# Altium footprint library Evaluation Board.PcbLib: 121 footprints (part 3 of 8)
Each footprint in its own frame and in the unit in brackets; x right, y up, seen from the top. Pads: shape width x height; smd on the part's side, far side on the other; paste and mask are expansions set on the pad; w line width, h text height; cw(c..) or ccw(c..) is an arc to the next point about the centre after c.
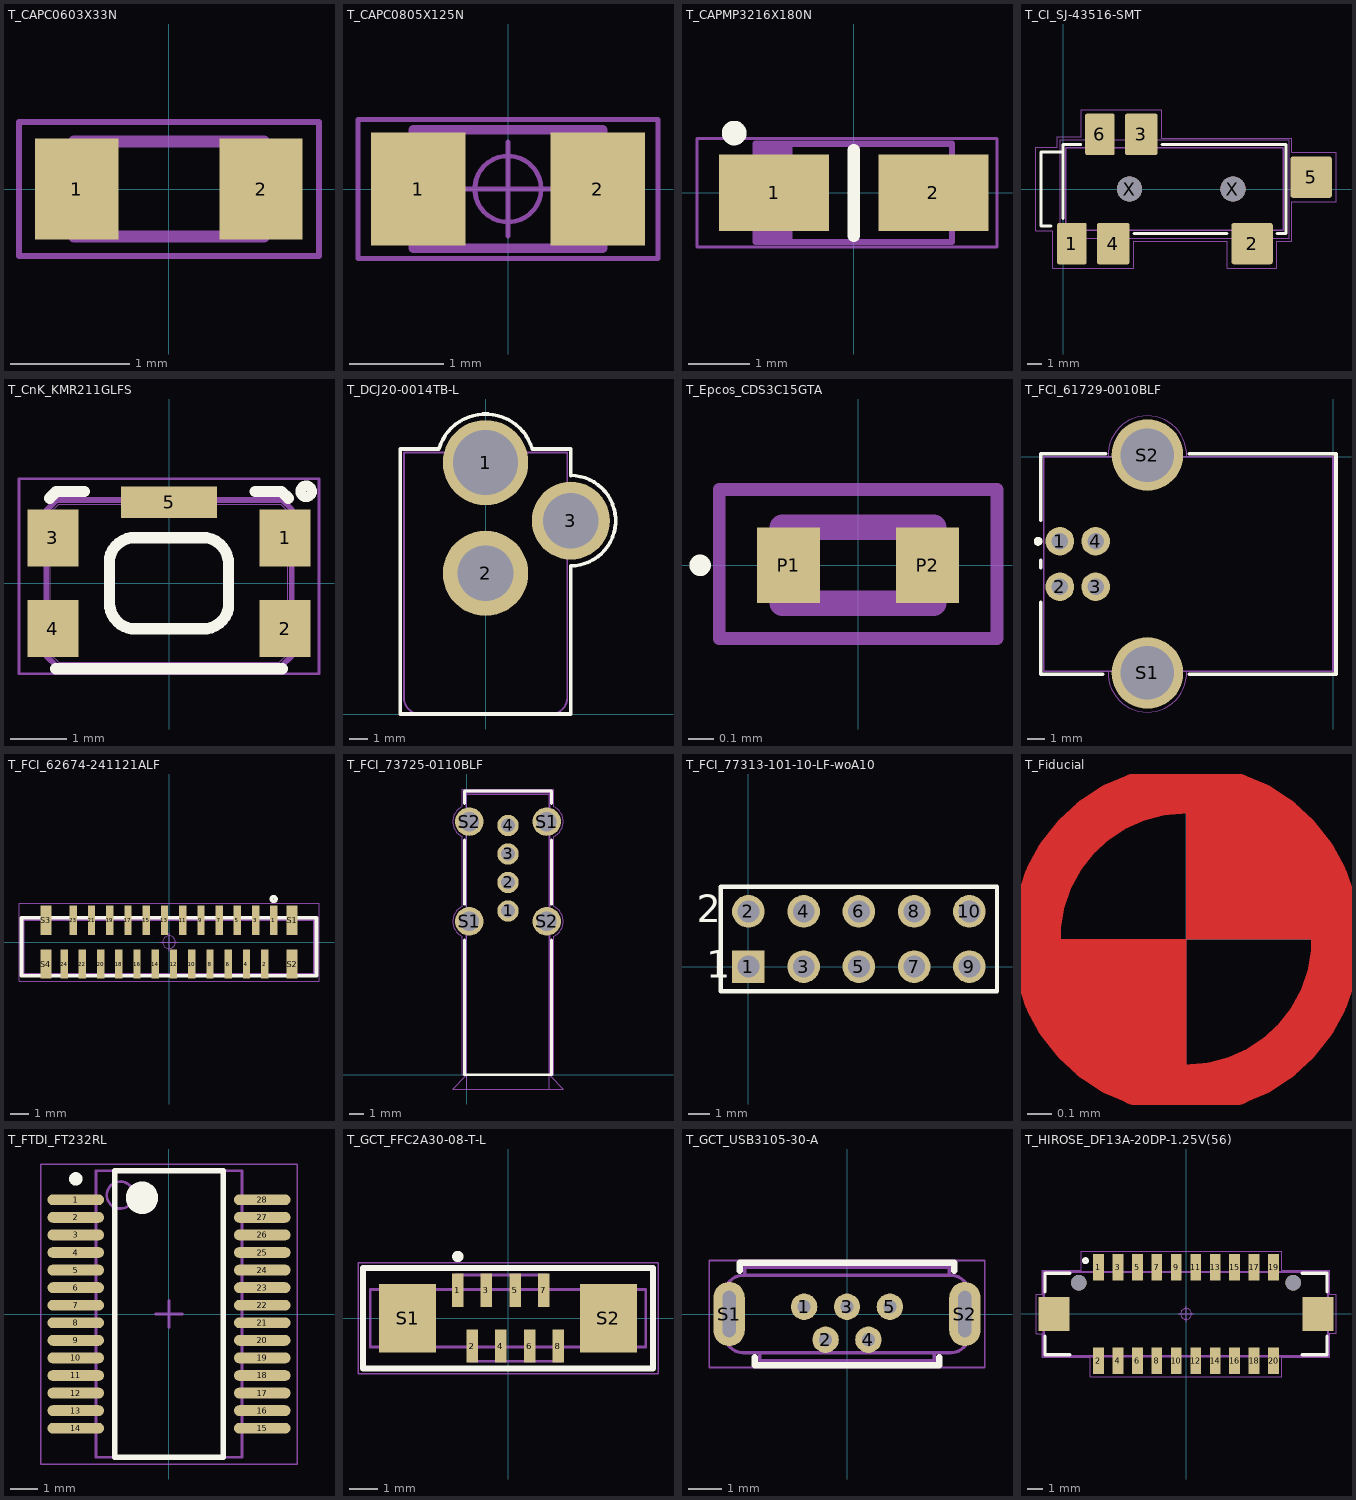
[diagram p2: the footprints below, top view; thin cyan lines are the x and y axes]

## T_CAPC0603X33N [mm]
height 0.8
pads (2):
  rect 0.7x0.85 smd: 1(-0.775,0) 2(0.775,0)
Mechanical 1:
  lines w0.05: -1.261,-0.563 -1.261,0.563 1.262,0.563 1.262,-0.563 -1.261,-0.563
Mechanical 2:
  lines w0.001: -0.8,-0.4 -0.8,0.4 0.8,0.4 0.8,-0.4 -0.8,-0.4
Mechanical 3:
  lines w0.1: -0.8,-0.4 -0.8,0.4 0.8,0.4 0.8,-0.4 -0.8,-0.4
3D body: height 0.9, standoff 0, extent -0.8,-0.4 0.8,0.4

## T_CAPC0805X125N [mm]
height 1.25
pads (2):
  rect 1x1.2 smd: 1(-0.95,0) 2(0.95,0)
Mechanical 1:
  circle w0.05: c0,0 r0.35
  lines w0.05: -0.5,0 0.5,0 ; 0,-0.5 0,0.5 ; -1.586,-0.736 1.586,-0.736 1.586,0.736 -1.586,0.736 -1.586,-0.736
Mechanical 2:
  lines w0.001: -1,-0.625 -1,0.625 1,0.625 1,-0.625 -1,-0.625
Mechanical 3:
  lines w0.1: -1,-0.625 1,-0.625 1,0.625 -1,0.625 -1,-0.625
3D body: height 1.4, standoff 0, extent -1,-0.625 1,0.625

## T_CAPMP3216X180N [mm]
height 1.6
pads (2):
  rect 1.8x1.25 smd: 1(-1.3,0) 2(1.3,0)
Top Overlay:
  circle w0.3: c-1.95,0.975 r0.05
  lines w0.2: 0,-0.699 0,0.699
Mechanical 1:
  lines w0.05: -2.556,-0.886 2.336,-0.886 2.336,0.886 -2.556,0.886 -2.556,-0.886
Mechanical 2:
  lines w0.001: -1.6,-0.8 -1.6,0.8 1.6,0.8 1.6,-0.8 -1.6,-0.8
Mechanical 3:
  lines w0.1: -1.55,-0.8 -1.55,0.8 ; -1.45,-0.8 -1.45,0.8 ; -1.35,-0.8 -1.35,0.8 ; -1.25,-0.8 -1.25,0.8 ; -1.15,-0.8 -1.15,0.8 ; -1.05,-0.8 -1.05,0.8 ; -1.6,-0.8 -1.6,0.8 1.6,0.8 1.6,-0.8 -1.6,-0.8
3D body: height 1.6, standoff 0, extent -1.6,-0.8 -1,0.8
3D body: height 1.6, standoff 0, extent -1,-0.8 1.6,0.8

## T_CI_SJ-43516-SMT [mm] "STEREO_3.5mm AUDIO JACK  CUI"
height 5
pads (8):
  rrect12% 2x2.8 smd: 1(0.6,-3.7) 6(2.5,3.7)
  rrect12% 2.8x2.8 smd: 2(12.8,-3.7) 5(16.8,0.8)
  rrect12% 2.2x2.8 smd: 3(5.3,3.7) 4(3.4,-3.7)
  round 1.7 hole 1.7 unplated: X(4.5,0) X(11.5,0)
Top Overlay:
  lines w0.2: -0.8,-2.5 -1.5,-2.5 -1.5,2.5 0,2.5 ; 0,-2 0,3 1.2,3 ; 4.8,-3 11.1,-3 ; 6.7,3 15.1,3 15.1,-3 14.5,-3
Mechanical 1:
  lines w0.05: -1.83,-2.83 -1.83,2.83 -0.39,2.83 -0.39,3.53 1.22,3.53 1.22,5.38 6.68,5.38 6.68,3.45 15.48,3.45 15.48,2.48 18.48,2.48 18.48,-0.87 15.48,-0.87 15.48,-3.53 14.48,-3.53 14.48,-5.38 11.12,-5.38 11.12,-3.53 4.78,-3.53 4.78,-5.38 -0.68,-5.38 -0.68,-2.83 -1.83,-2.83
Mechanical 2:
  lines w0.001: -0.2,-3.35 -0.2,3.35 15.3,3.35 15.3,-3.35 -0.2,-3.35
Mechanical 3:
  lines w0.1: 0.2,-2.8 14.9,-2.8 14.9,2.8 0.2,2.8 0.2,-2.8

## T_CnK_KMR211GLFS [mm] "Microminiature Tact Switch for SMT"
height 1.9
pads (5):
  rect 0.9x1 smd: 1(2.05,0.8) 2(2.05,-0.8) 3(-2.05,0.8) 4(-2.05,-0.8)
  rect 1.7x0.55 smd: 5(0,1.43)
Top Overlay:
  circle w0.18: c2.424,1.624 r0.1
  lines w0.2: -2.109,1.502 -1.991,1.62 -1.5,1.62 ; -2,-1.51 2,-1.51 ; -1.05,-0.36 -1.05,0.44 ; -1.05,-0.35 ccw(c-0.59,-0.35) -0.662,-0.804 ; -1.05,0.444 cw(c-0.6,0.35) -0.669,0.805 ; -0.66,0.805 0.66,0.805 ; -0.655,-0.805 0.65,-0.805 ; 0.669,-0.805 ccw(c0.6,-0.35) 1.05,-0.444 ; 0.684,0.8 cw(c0.59,0.35) 1.045,0.419 ; 1.05,-0.44 1.05,0.4 ; 1.52,1.621 1.989,1.621 2.108,1.502
Mechanical 1:
  lines w0.05: -2.65,-1.6 -2.65,1.845 2.65,1.845 2.65,-1.6 -2.65,-1.6
Mechanical 2:
  lines w0.001: -2.1,-1.25 -2.1,1.25 -1.95,1.4 1.97,1.4 2.1,1.27 2.1,-1.25 1.95,-1.4 -1.95,-1.4 -2.1,-1.25
Mechanical 3:
  lines w0.1: -2.17,-1.28 -2.17,1.28 -1.98,1.47 2,1.47 2.17,1.3 2.17,-1.28 1.98,-1.47 -1.98,-1.47 -2.17,-1.28

## T_DCJ20-0014TB-L [mm] "Header, 1x2 Pins, 2.54 mm pitch, male"
height 10.7
pads (3):
  round 4.7 hole 3.58: 1(0,13.85)
  round 4.7 hole 3.07: 2(0,7.75)
  round 4.3 hole 3.07: 3(4.7,10.65)
Top Overlay:
  lines w0.2: -2.569,14.598 cw(c0,13.85) 2.569,14.6 4.7,14.6 4.7,13.142 cw(c4.675,10.65) 4.7,8.158 ; -2.569,14.6 -4.7,14.6 -4.7,0 4.675,0 ; 4.7,0 4.7,8.157
Mechanical 1:
  lines w0.05: 4.675,0 -4.7,0 -4.7,14.6 -2.568,14.6 cw(c0,13.85) 2.568,14.6 4.7,14.6 4.7,13.125 cw(c4.7,10.65) 4.7,8.175 4.7,0
Mechanical 2:
  lines w0.001: -1.4,13.95 -1.4,14.4 -4.5,14.4 -4.5,0.9 ccw(c-3.6,0.9) -3.6,0 3.6,0 ; 1.4,13.95 1.4,14.4 4.5,14.4 4.5,0.9 cw(c3.6,0.9) 3.6,0
Mechanical 3:
  lines w0.1: -4.5,0.9 ccw(c-3.6,0.9) -3.6,0 3.6,0 ccw(c3.6,0.9) 4.5,0.9 4.5,14.4 -4.5,14.4 -4.5,0.9
3D body: height 7.4, standoff 5.4, extent -1,0 0.992,2
3D body: height 9.59, standoff 3.21, extent -3.2,0 3.175,2
3D body: height 4, standoff -3.7, extent -1.4,13.75 1.4,13.95
3D body: height 4, standoff -3.7, extent -1.2,7.65 1.2,7.85
3D body: height 4, standoff -3.7, extent 4.5,9.45 4.7,11.85
3D body: height 10.7, standoff 0, extent -4.5,0 4.5,14.4

## T_Epcos_CDS3C15GTA [mm] "Bidirectional ESD Protection"
height 0.27
pads (2):
  rect 0.25x0.3 smd: P1(-0.275,0) P2(0.275,0)
Top Overlay:
  circle w0.06: c-0.625,0 r0.012
Mechanical 1:
  lines w0.05: -0.55,-0.29 -0.55,0.3 0.55,0.3 0.55,-0.29 -0.55,-0.29
Mechanical 2:
  lines w0.001: -0.315,-0.165 -0.315,0.165 0.315,0.165 0.315,-0.165 -0.315,-0.165
Mechanical 3:
  lines w0.1: -0.3,-0.15 -0.3,0.15 0.3,0.15 0.3,-0.15 -0.3,-0.15
3D body: height 0.27, standoff 0, extent -0.315,-0.165 0.315,0.165

## T_FCI_61729-0010BLF [mm] "USB Type B Connectors"
height 10.6
pads (6):
  round 1.6 hole 0.92: 1(-15.3,-4.73) 2(-15.3,-7.27) 3(-13.3,-7.27) 4(-13.3,-4.73)
  round 4 hole 3: S1(-10.4,-12.1) S2(-10.4,0.1)
Top Overlay:
  circle w0.25: c-16.512,-4.73 r0.125
  lines w0.2: -16.362,-8.14 -16.362,-12.163 -12.89,-12.163 ; -16.362,-6.21 -16.362,-5.8 ; -16.362,-3.55 -16.362,0.162 -12.737,0.162 ; -8.062,-12.163 0.163,-12.163 0.163,0.162 -8.062,0.162
Mechanical 1:
  lines w0.05: -16.2,-12 -16.2,0 -12.598,0 cw(c-10.4,0.096) -8.202,0 -0.003,0 0,-0.003 0,-12 -8.202,-12 cw(c-10.4,-12.096) -12.598,-12 -16.2,-12
Mechanical 2:
  lines w0.001: -16.2,-12 -16.2,0 0,0 0,-12 -16.2,-12
Mechanical 3:
  lines w0.1: -16.2,-12 -16.2,0 0,0 0,-12 -16.2,-12
3D body "Samtec-USBR-B-F-S-O-TH.STEP": height 11.02, standoff -3.7, extent -16.61,-13.43 -0.31,1.469

## T_FCI_62674-241121ALF [mm] "DVI FFC Connector 0.5mm pitch"
height 4.1
pads (28):
  rect 0.4x1.6 smd: 1(5.75,1.2) 2(5.25,-1.2) 3(4.75,1.2) 4(4.25,-1.2) 5(3.75,1.2) 6(3.25,-1.2) 7(2.75,1.2) 8(2.25,-1.2) 9(1.75,1.2) 10(1.25,-1.2) 11(0.75,1.2) 12(0.25,-1.2) 13(-0.25,1.2) 14(-0.75,-1.2) 15(-1.25,1.2) 16(-1.75,-1.2) 17(-2.25,1.2) 18(-2.75,-1.2) 19(-3.25,1.2) 20(-3.75,-1.2) 21(-4.25,1.2) 22(-4.75,-1.2) 23(-5.25,1.2) 24(-5.75,-1.2)
  rect 0.6x1.6 smd: S1(6.75,1.2) S2(6.75,-1.199) S3(-6.75,1.2) S4(-6.75,-1.2)
Top Overlay:
  circle w0.2: c5.742,2.367 r0.125
  lines w0.2: -8.089,-1.836 8.086,-1.836 8.086,1.342 -8.086,1.342 -8.086,-1.831
Mechanical 1:
  circle w0.05: c0,0 r0.35
  lines w0.05: -0.5,0 0.5,0 ; 0,-0.5 0,0.5 ; -8.226,-2.141 -8.226,2.141 8.226,2.141 8.226,-2.141 -8.226,-2.141
Mechanical 2:
  lines w0.001: -7.95,-1.7 -7.95,1.2 7.95,1.2 7.95,-1.7 -7.95,-1.7
Mechanical 3:
  lines w0.1: -8.011,-1.761 -8.011,1.276 8.011,1.276 8.011,-1.761 -8.011,-1.761

## T_FCI_73725-0110BLF [mm] "USB Type A Connector Vertical"
height 13.83
pads (8):
  round 1.5 hole 0.95: 1(2.88,11.49) 2(2.88,13.49) 3(2.88,15.49) 4(2.88,17.49)
  round 2 hole 1.37: S1(0.16,10.76) S1(5.6,17.76) S2(0.16,17.76) S2(5.6,10.76)
Top Overlay:
  lines w0.2: -0.166,9.463 -0.166,0 5.926,0 5.926,9.463 ; -0.166,11.964 -0.166,16.474 ; -0.166,19.025 -0.166,19.898 5.926,19.898 5.926,19.025 ; 5.922,11.964 5.922,16.474
Mechanical 1:
  lines w0.05: -0.322,9.709 -0.322,0 6.081,0 6.081,9.707 ; -0.322,18.812 -0.322,20.046 -0.32,20.048 6.081,20.048 ; -0.321,9.708 cw(c0.16,10.76) -0.322,11.812 ; -0.321,11.813 -0.321,16.708 cw(c0.16,17.76) -0.322,18.812 ; 6.081,16.707 6.081,11.812 cw(c5.6,10.76) 6.082,9.708 ; 6.081,18.812 cw(c5.6,17.76) 6.082,16.708 ; 6.082,18.814 6.082,20.048
Mechanical 2:
  lines w0.001: 0,-1 0,19.678 5.76,19.678 5.76,-1 ; -1,-1 0,0 5.76,0 6.76,-1 -1,-1
Mechanical 3:
  lines w0.1: -0.068,19.778 5.826,19.778 5.826,0 -0.065,0 -0.065,19.778

## T_FCI_77313-101-10-LF-woA10 [mm] "2.54 mm header"
height 10.8
pads (10):
  rect 1.5x1.5 hole 1: 1(0,0)
  round 1.5 hole 1: 2(0,2.54) 3(2.54,0) 4(2.54,2.54) 5(5.08,0) 6(5.08,2.54) 7(7.62,0) 8(7.62,2.54) 9(10.16,0) 10(10.16,2.54)
Top Overlay:
  lines w0.2: -1.27,-1.14 11.43,-1.14 ; -1.27,-1.137 -1.27,3.68 11.43,3.68 11.43,-1.137
  text "2" at -2.364,2.048 h1.27
  text "1" at -1.941,-0.522 h1.27
Mechanical 1:
  lines w0.05: -1.27,-1.14 11.43,-1.14 ; -1.27,-1.137 -1.27,3.68 11.43,3.68 11.43,-1.137
Mechanical 2:
  lines w0.001: -1.27,-1.14 11.43,-1.14 11.43,3.68 -1.27,3.68 -1.27,-1.14
Mechanical 3:
  lines w0.1: -1.27,-1.14 11.43,-1.14 ; -1.27,-1.137 -1.27,3.68 11.43,3.68 11.43,-1.137

## T_Fiducial [mm] "Fiducial"
Top Layer:
  region: 0,-0.625 -0.375,-0.5 -0.625,-0.25 -0.625,0 0,0
  region: 0.625,0 0,0 0,0.625 0.375,0.5 0.625,0.25
  lines w0.203: 0,-0.625 ccw(c0,0) 0,0.625 ccw(c0,0) 0,-0.625
Top Solder:
  circle w0.203: c0,0 r0.625
  region: 0.625,0 0.5,-0.375 0.25,-0.625 -0.25,-0.625 -0.5,-0.375 -0.625,0 -0.5,0.375 -0.375,0.5 0,0.625 0.375,0.5 0.5,0.25 0.5,0.375 0.375,0.5

## T_FTDI_FT232RL [mm] "28-Pin SSOP 0.65 mm Pitch"
height 2
pads (28):
  oval 2.1x0.4 smd: 1(-3.45,4.225) 2(-3.45,3.575) 3(-3.45,2.925) 4(-3.45,2.275) 5(-3.45,1.625) 6(-3.45,0.975) 7(-3.45,0.325) 8(-3.45,-0.325) 9(-3.45,-0.975) 10(-3.45,-1.625) 11(-3.45,-2.275) 12(-3.45,-2.925) 13(-3.45,-3.575) 14(-3.45,-4.225) 15(3.45,-4.225) 16(3.45,-3.575) 17(3.45,-2.925) 18(3.45,-2.275) 19(3.45,-1.625) 20(3.45,-0.975) 21(3.45,-0.325) 22(3.45,0.325) 23(3.45,0.975) 24(3.45,1.625) 25(3.45,2.275) 26(3.45,2.925) 27(3.45,3.575) 28(3.45,4.225)
Top Overlay:
  circle w0.6: c-1,4.3 r0.3
  circle w0.25: c-3.45,5 r0.125
  lines w0.2: -2,-5.3 2,-5.3 2,5.3 -2,5.3 -2,-5.3
Mechanical 1:
  lines w0.05: -4.75,-5.55 -4.75,5.55 4.75,5.55 4.75,-5.55 -4.75,-5.55
  lines w0.1: -0.5,0 0.5,0 ; 0,-0.5 0,0.5
Mechanical 2:
  lines w0.001: -2.7,-5.3 2.7,-5.3 2.7,5.3 -2.7,5.3 -2.7,-5.3
Mechanical 3:
  circle w0.1: c-1.8,4.4 r0.5
  lines w0.1: -2.7,-5.3 -2.7,5.3 2.7,5.3 2.7,-5.3 -2.7,-5.3
3D body: height 2, standoff 0, extent -2.7,-5.3 2.7,5.3

## T_GCT_FFC2A30-08-T-L [mm] "JTAG FFC Connector 0.5mm pitch vertical"
height 5.4
pads (10):
  rect 0.4x1.15 smd: 1(-1.75,0.975) 2(-1.25,-0.975) 3(-0.75,0.975) 4(-0.25,-0.975) 5(0.25,0.975) 6(0.75,-0.975) 7(1.25,0.975) 8(1.75,-0.975)
  rect 2x2.4 smd: S1(-3.5,0) S2(3.5,0)
Top Overlay:
  circle w0.254: c-1.75,2.15 r0.071
  lines w0.2: -5.05,-1.75 -5.05,1.75 5.05,1.75 5.05,-1.75 -5.05,-1.75
Mechanical 1:
  lines w0.05: -5.225,-1.925 -5.225,1.925 5.225,1.925 5.225,-1.925 -5.225,-1.925
Mechanical 2:
  lines w0.001: -4.25,-1 -4.25,1 ; -1.85,1 -1.85,1.5 1.35,1.5 1.35,1 ; -1.35,-1 -1.35,-1.5 1.85,-1.5 1.85,-1 ; 4.25,-1 4.25,1 ; -4.8,-1 -4.8,1 4.8,1 4.8,-1 -4.8,-1
Mechanical 3:
  lines w0.1: -1.85,1 -1.85,1.5 1.35,1.5 1.35,1 ; -1.35,-1 -1.35,-1.5 1.85,-1.5 1.85,-1 ; -4.8,-1 4.8,-1 4.8,1 -4.8,1 -4.8,-1
3D body: height 4.4, standoff 2.5, extent -4.8,-1 4.8,1
3D body: height 2.5, standoff 0, extent -4.25,-1 4.25,1

## T_GCT_USB3105-30-A [mm] "Micro USB Connector Vertical"
height 5.6
pads (7):
  round 0.8 hole 0.4: 1(-1.3,0.22) 2(-0.65,-0.78) 3(0,0.22) 4(0.65,-0.78) 5(1.3,0.22)
  oval 0.95x1.95 hole 0.4 slot 1.4 at 90 deg: S1(-3.575,0) S2(3.575,0)
Top Overlay:
  lines w0.2: -3.25,1.32 -3.25,1.55 3.25,1.55 3.25,1.32 ; -2.8,-1.32 -2.8,-1.55 2.8,-1.55 2.8,-1.32
Mechanical 1:
  lines w0.05: -4.175,-1.625 4.175,-1.625 4.175,1.625 -4.175,1.625 -4.175,-1.625
Mechanical 2:
  lines w0.001: -3.7,-0.175 -3.945,-0.175 -3.945,0.625 -3.7,0.625 ; -3.1,1.175 -3.1,1.42 3.1,1.42 3.1,1.175 ; -2.65,-1.175 -2.65,-1.42 2.65,-1.42 2.65,-1.175 ; 3.15,1.175 cw(c3.15,0.625) 3.7,0.625 ; 3.175,1.175 -3.15,1.175 ccw(c-3.15,0.625) -3.7,0.625 ; 3.7,-0.175 3.945,-0.175 3.945,0.625 3.7,0.625 ; -3.7,0.625 -3.7,-0.625 ccw(c-3.15,-0.625) -3.15,-1.175 3.15,-1.175 ccw(c3.15,-0.625) 3.7,-0.625 3.7,0.625
Mechanical 3:
  lines w0.1: -3.7,-0.175 -3.945,-0.175 -3.945,0.625 -3.7,0.625 ; -3.1,1.175 -3.1,1.42 3.1,1.42 3.1,1.175 ; -2.65,-1.175 -2.65,-1.42 2.65,-1.42 2.65,-1.175 ; 3.15,1.175 cw(c3.15,0.625) 3.7,0.625 ; 3.175,1.175 -3.15,1.175 ccw(c-3.15,0.625) -3.7,0.625 ; 3.7,-0.175 3.945,-0.175 3.945,0.625 3.7,0.625 ; -3.7,0.625 -3.7,-0.625 ccw(c-3.15,-0.625) -3.15,-1.175 3.15,-1.175 ccw(c3.15,-0.625) 3.7,-0.625 3.7,0.625
3D body "USB3105.STEP": height 5.62, standoff -1.48, extent -3.98,-1.455 3.98,1.48

## T_HIROSE_DF13A-20DP-1.25V(56) [mm]
height 4.8
pads (24):
  rect 0.7x1.7 smd: 1(-5.625,3) 2(-5.625,-3) 3(-4.375,3) 4(-4.375,-3) 5(-3.125,3) 6(-3.125,-3) 7(-1.875,3) 8(-1.875,-3) 9(-0.625,3) 10(-0.625,-3) 11(0.625,3) 12(0.625,-3) 13(1.875,3) 14(1.875,-3) 15(3.125,3) 16(3.125,-3) 17(4.375,3) 18(4.375,-3) 19(5.625,3) 20(5.625,-3)
  rect 2x2.2 smd: ""(-8.475,0) ""(8.475,0)
  round 1 hole 1 unplated paste+0 mask+0: ""(-6.875,2) ""(6.875,2)
Top Overlay:
  circle w0.2: c-6.455,3.42 r0.125
  lines w0.2: -9.04,-1.42 -9.04,-2.62 -7.463,-2.62 ; -9.04,1.41 -9.04,2.61 -7.463,2.61 ; 7.463,-2.62 9.04,-2.62 9.04,-1.42 ; 7.463,2.61 9.04,2.61 9.04,1.41
Mechanical 1:
  circle w0.05: c0,0 r0.35
  lines w0.05: -0.5,0 0.5,0 ; 0,-0.5 0,0.5 ; 9.222,1.255 9.222,2.804 8.052,2.804 6.136,2.804 6.136,4.01 -6.726,4.01 -6.726,2.796 -9.216,2.796 -9.216,1.652 -9.216,1.252 -9.63,1.252 -9.63,-1.258 -9.218,-1.258 -9.218,-2.796 -6.142,-2.796 -6.142,-4.02 6.143,-4.02 6.143,-2.796 9.221,-2.796 9.221,-1.248 9.63,-1.248 ; 9.224,1.255 9.63,1.255 9.63,-1.237
Mechanical 2:
  lines w0.001: -9.175,-2.75 -9.175,2.75 9.175,2.75 9.175,-2.75 -9.175,-2.75
Mechanical 3:
  lines w0.1: -9.1,-2.68 -9.1,2.67 9.1,2.67 9.1,-2.68 -9.1,-2.68
3D body "DF13A-20DP-1.25V.stp": height 4.8, standoff 0, extent -9.175,-3.45 9.175,3.45